# Altium schematic symbol library 场效应管.SchLib: 1062 symbols (part 2 of 4)
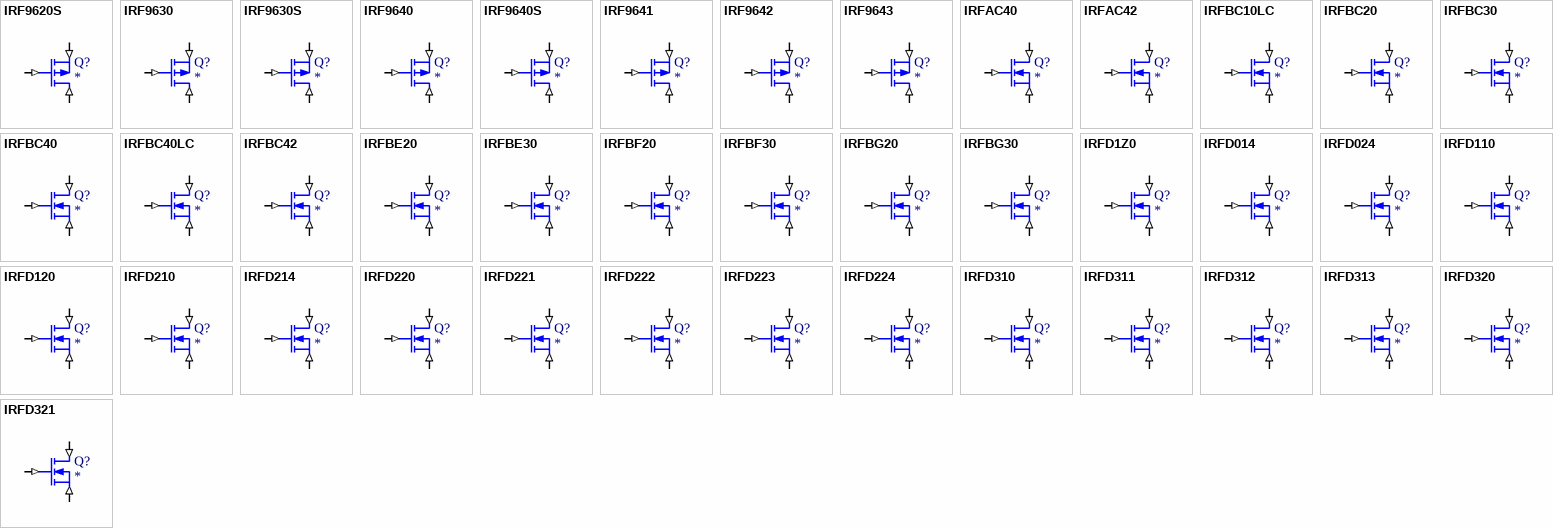
[diagram p27: symbols IRF9620S to IRFD321]

## IRFBC40
designator Q?
N-Channel MOSFET
simulation model IRFBC40 (SUBCKT)
pins: 1 D (in), 2 G (in), 3 S (in)
1 alternate drawing of the same symbol

## IRFBC40LC
designator Q?
N-Channel MOSFET
simulation model IRFBC40LC (SUBCKT)
pins: 1 D (in), 2 G (in), 3 S (in)
1 alternate drawing of the same symbol

## IRFBC42
designator Q?
N-Channel MOSFET
simulation model IRFBC42 (SUBCKT)
pins: 1 D (in), 2 G (in), 3 S (in)
1 alternate drawing of the same symbol

## IRFBE20
designator Q?
N-Channel MOSFET
simulation model IRFBE20 (SUBCKT)
pins: 1 D (in), 2 G (in), 3 S (in)
1 alternate drawing of the same symbol

## IRFBE30
designator Q?
N-Channel MOSFET
simulation model IRFBE30 (SUBCKT)
pins: 1 D (in), 2 G (in), 3 S (in)
1 alternate drawing of the same symbol

## IRFBF20
designator Q?
N-Channel MOSFET
simulation model IRFBF20 (SUBCKT)
pins: 1 D (in), 2 G (in), 3 S (in)
1 alternate drawing of the same symbol

## IRFBF30
designator Q?
N-Channel MOSFET
simulation model IRFBF30 (SUBCKT)
pins: 1 D (in), 2 G (in), 3 S (in)
1 alternate drawing of the same symbol

## IRFBG20
designator Q?
N-Channel MOSFET
simulation model IRFBG20 (SUBCKT)
pins: 1 D (in), 2 G (in), 3 S (in)
1 alternate drawing of the same symbol

## IRFBG30
designator Q?
N-Channel MOSFET
simulation model IRFBG30 (SUBCKT)
pins: 1 D (in), 2 G (in), 3 S (in)
1 alternate drawing of the same symbol

## IRFD1Z0
designator Q?
N-Channel MOSFET
simulation model IRFD1Z0 (SUBCKT)
pins: 1 D (in), 2 G (in), 3 S (in)
1 alternate drawing of the same symbol

## IRFD014
designator Q?
N-Channel MOSFET
simulation model IRFD014 (SUBCKT)
pins: 1 D (in), 2 G (in), 3 S (in)
1 alternate drawing of the same symbol

## IRFD024
designator Q?
N-Channel MOSFET
simulation model IRFD024 (SUBCKT)
pins: 1 D (in), 2 G (in), 3 S (in)
1 alternate drawing of the same symbol

## IRFD110
designator Q?
N-Channel MOSFET
simulation model IRFD110 (SUBCKT)
pins: 1 D (in), 2 G (in), 3 S (in)
1 alternate drawing of the same symbol

## IRFD120
designator Q?
N-Channel MOSFET
simulation model IRFD120 (SUBCKT)
pins: 1 D (in), 2 G (in), 3 S (in)
1 alternate drawing of the same symbol

## IRFD210
designator Q?
N-Channel MOSFET
simulation model IRFD210 (SUBCKT)
pins: 1 D (in), 2 G (in), 3 S (in)
1 alternate drawing of the same symbol

## IRFD214
designator Q?
N-Channel MOSFET
simulation model IRFD214 (SUBCKT)
pins: 1 D (in), 2 G (in), 3 S (in)
1 alternate drawing of the same symbol

## IRFD220
designator Q?
N-Channel MOSFET
simulation model IRFD220 (SUBCKT)
pins: 1 D (in), 2 G (in), 3 S (in)
1 alternate drawing of the same symbol

## IRFD221
designator Q?
N-Channel MOSFET
simulation model IRFD221 (SUBCKT)
pins: 1 D (in), 2 G (in), 3 S (in)
1 alternate drawing of the same symbol

## IRFD222
designator Q?
N-Channel MOSFET
simulation model IRFD222 (SUBCKT)
pins: 1 D (in), 2 G (in), 3 S (in)
1 alternate drawing of the same symbol

## IRFD223
designator Q?
N-Channel MOSFET
simulation model IRFD223 (SUBCKT)
pins: 1 D (in), 2 G (in), 3 S (in)
1 alternate drawing of the same symbol

## IRFD224
designator Q?
N-Channel MOSFET
simulation model IRFD224 (SUBCKT)
pins: 1 D (in), 2 G (in), 3 S (in)
1 alternate drawing of the same symbol

## IRFD310
designator Q?
N-Channel MOSFET
simulation model IRFD310 (SUBCKT)
pins: 1 D (in), 2 G (in), 3 S (in)
1 alternate drawing of the same symbol

## IRFD311
designator Q?
N-Channel MOSFET
simulation model IRFD311 (SUBCKT)
pins: 1 D (in), 2 G (in), 3 S (in)
1 alternate drawing of the same symbol

## IRFD312
designator Q?
N-Channel MOSFET
simulation model IRFD312 (SUBCKT)
pins: 1 D (in), 2 G (in), 3 S (in)
1 alternate drawing of the same symbol

## IRFD313
designator Q?
N-Channel MOSFET
simulation model IRFD313 (SUBCKT)
pins: 1 D (in), 2 G (in), 3 S (in)
1 alternate drawing of the same symbol

## IRFD320
designator Q?
N-Channel MOSFET
simulation model IRFD320 (SUBCKT)
pins: 1 D (in), 2 G (in), 3 S (in)
1 alternate drawing of the same symbol

## IRFD321
designator Q?
N-Channel MOSFET
simulation model IRFD321 (SUBCKT)
pins: 1 D (in), 2 G (in), 3 S (in)
1 alternate drawing of the same symbol

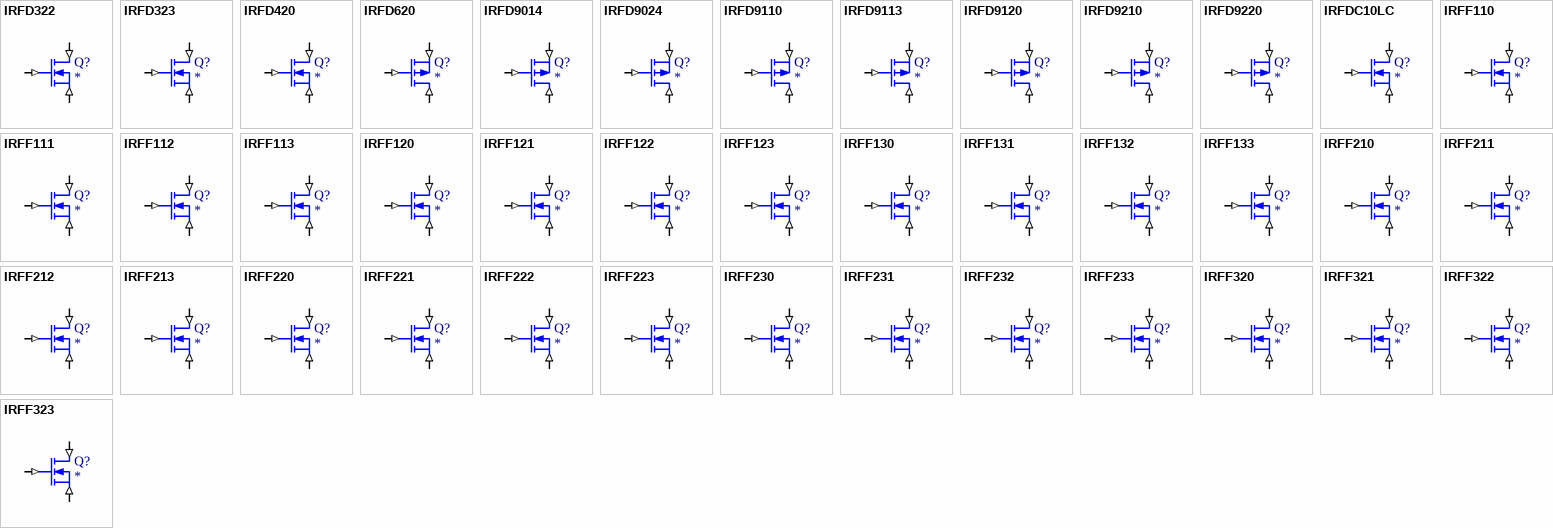
[diagram p9: symbols IRFD322 to IRFF323]

## IRFD322
designator Q?
N-Channel MOSFET
simulation model IRFD322 (SUBCKT)
pins: 1 D (in), 2 G (in), 3 S (in)
1 alternate drawing of the same symbol

## IRFD323
designator Q?
N-Channel MOSFET
simulation model IRFD323 (SUBCKT)
pins: 1 D (in), 2 G (in), 3 S (in)
1 alternate drawing of the same symbol

## IRFD420
designator Q?
N-Channel MOSFET
simulation model IRFD420 (SUBCKT)
pins: 1 D (in), 2 G (in), 3 S (in)
1 alternate drawing of the same symbol

## IRFD620
designator Q?
P-Channel MOSFET
simulation model IRFD620 (SUBCKT)
pins: 1 D (in), 2 G (in), 3 S (in)
1 alternate drawing of the same symbol

## IRFD9014
designator Q?
P-Channel MOSFET
simulation model IRFD9014 (SUBCKT)
pins: 1 D (in), 2 G (in), 3 S (in)
1 alternate drawing of the same symbol

## IRFD9024
designator Q?
P-Channel MOSFET
simulation model IRFD9024 (SUBCKT)
pins: 1 D (in), 2 G (in), 3 S (in)
1 alternate drawing of the same symbol

## IRFD9110
designator Q?
P-Channel MOSFET
simulation model IRFD9110 (SUBCKT)
pins: 1 D (in), 2 G (in), 3 S (in)
1 alternate drawing of the same symbol

## IRFD9113
designator Q?
P-Channel MOSFET
simulation model IRFD9113 (SUBCKT)
pins: 1 D (in), 2 G (in), 3 S (in)
1 alternate drawing of the same symbol

## IRFD9120
designator Q?
P-Channel MOSFET
simulation model IRFD9120 (SUBCKT)
pins: 1 D (in), 2 G (in), 3 S (in)
1 alternate drawing of the same symbol

## IRFD9210
designator Q?
P-Channel MOSFET
simulation model IRFD9210 (SUBCKT)
pins: 1 D (in), 2 G (in), 3 S (in)
1 alternate drawing of the same symbol

## IRFD9220
designator Q?
P-Channel MOSFET
simulation model IRFD9220 (SUBCKT)
pins: 1 D (in), 2 G (in), 3 S (in)
1 alternate drawing of the same symbol

## IRFDC10LC
designator Q?
N-Channel MOSFET
simulation model IRFDC10LC (SUBCKT)
pins: 1 D (in), 2 G (in), 3 S (in)
1 alternate drawing of the same symbol

## IRFF110
designator Q?
N-Channel MOSFET
simulation model IRFF110 (SUBCKT)
pins: 1 D (in), 2 G (in), 3 S (in)
1 alternate drawing of the same symbol

## IRFF111
designator Q?
N-Channel MOSFET
simulation model IRFF111 (SUBCKT)
pins: 1 D (in), 2 G (in), 3 S (in)
1 alternate drawing of the same symbol

## IRFF112
designator Q?
N-Channel MOSFET
simulation model IRFF112 (SUBCKT)
pins: 1 D (in), 2 G (in), 3 S (in)
1 alternate drawing of the same symbol

## IRFF113
designator Q?
N-Channel MOSFET
simulation model IRFF113 (SUBCKT)
pins: 1 D (in), 2 G (in), 3 S (in)
1 alternate drawing of the same symbol

## IRFF120
designator Q?
N-Channel MOSFET
simulation model IRFF120 (SUBCKT)
pins: 1 D (in), 2 G (in), 3 S (in)
1 alternate drawing of the same symbol

## IRFF121
designator Q?
N-Channel MOSFET
simulation model IRFF121 (SUBCKT)
pins: 1 D (in), 2 G (in), 3 S (in)
1 alternate drawing of the same symbol

## IRFF122
designator Q?
N-Channel MOSFET
simulation model IRFF122 (SUBCKT)
pins: 1 D (in), 2 G (in), 3 S (in)
1 alternate drawing of the same symbol

## IRFF123
designator Q?
N-Channel MOSFET
simulation model IRFF123 (SUBCKT)
pins: 1 D (in), 2 G (in), 3 S (in)
1 alternate drawing of the same symbol

## IRFF130
designator Q?
N-Channel MOSFET
simulation model IRFF130 (SUBCKT)
pins: 1 D (in), 2 G (in), 3 S (in)
1 alternate drawing of the same symbol

## IRFF131
designator Q?
N-Channel MOSFET
simulation model IRFF131 (SUBCKT)
pins: 1 D (in), 2 G (in), 3 S (in)
1 alternate drawing of the same symbol

## IRFF132
designator Q?
N-Channel MOSFET
simulation model IRFF132 (SUBCKT)
pins: 1 D (in), 2 G (in), 3 S (in)
1 alternate drawing of the same symbol

## IRFF133
designator Q?
N-Channel MOSFET
simulation model IRFF133 (SUBCKT)
pins: 1 D (in), 2 G (in), 3 S (in)
1 alternate drawing of the same symbol

## IRFF210
designator Q?
N-Channel MOSFET
simulation model IRFF210 (SUBCKT)
pins: 1 D (in), 2 G (in), 3 S (in)
1 alternate drawing of the same symbol

## IRFF211
designator Q?
N-Channel MOSFET
simulation model IRFF211 (SUBCKT)
pins: 1 D (in), 2 G (in), 3 S (in)
1 alternate drawing of the same symbol

## IRFF212
designator Q?
N-Channel MOSFET
simulation model IRFF212 (SUBCKT)
pins: 1 D (in), 2 G (in), 3 S (in)
1 alternate drawing of the same symbol

## IRFF213
designator Q?
N-Channel MOSFET
simulation model IRFF213 (SUBCKT)
pins: 1 D (in), 2 G (in), 3 S (in)
1 alternate drawing of the same symbol

## IRFF220
designator Q?
N-Channel MOSFET
simulation model IRFF220 (SUBCKT)
pins: 1 D (in), 2 G (in), 3 S (in)
1 alternate drawing of the same symbol

## IRFF221
designator Q?
N-Channel MOSFET
simulation model IRFF221 (SUBCKT)
pins: 1 D (in), 2 G (in), 3 S (in)
1 alternate drawing of the same symbol

## IRFF222
designator Q?
N-Channel MOSFET
simulation model IRFF222 (SUBCKT)
pins: 1 D (in), 2 G (in), 3 S (in)
1 alternate drawing of the same symbol

## IRFF223
designator Q?
N-Channel MOSFET
simulation model IRFF223 (SUBCKT)
pins: 1 D (in), 2 G (in), 3 S (in)
1 alternate drawing of the same symbol

## IRFF230
designator Q?
N-Channel MOSFET
simulation model IRFF230 (SUBCKT)
pins: 1 D (in), 2 G (in), 3 S (in)
1 alternate drawing of the same symbol

## IRFF231
designator Q?
N-Channel MOSFET
simulation model IRFF231 (SUBCKT)
pins: 1 D (in), 2 G (in), 3 S (in)
1 alternate drawing of the same symbol

## IRFF232
designator Q?
N-Channel MOSFET
simulation model IRFF232 (SUBCKT)
pins: 1 D (in), 2 G (in), 3 S (in)
1 alternate drawing of the same symbol

## IRFF233
designator Q?
N-Channel MOSFET
simulation model IRFF233 (SUBCKT)
pins: 1 D (in), 2 G (in), 3 S (in)
1 alternate drawing of the same symbol

## IRFF320
designator Q?
N-Channel MOSFET
simulation model IRFF320 (SUBCKT)
pins: 1 D (in), 2 G (in), 3 S (in)
1 alternate drawing of the same symbol

## IRFF321
designator Q?
N-Channel MOSFET
simulation model IRFF321 (SUBCKT)
pins: 1 D (in), 2 G (in), 3 S (in)
1 alternate drawing of the same symbol

## IRFF322
designator Q?
N-Channel MOSFET
simulation model IRFF322 (SUBCKT)
pins: 1 D (in), 2 G (in), 3 S (in)
1 alternate drawing of the same symbol

## IRFF323
designator Q?
N-Channel MOSFET
simulation model IRFF323 (SUBCKT)
pins: 1 D (in), 2 G (in), 3 S (in)
1 alternate drawing of the same symbol

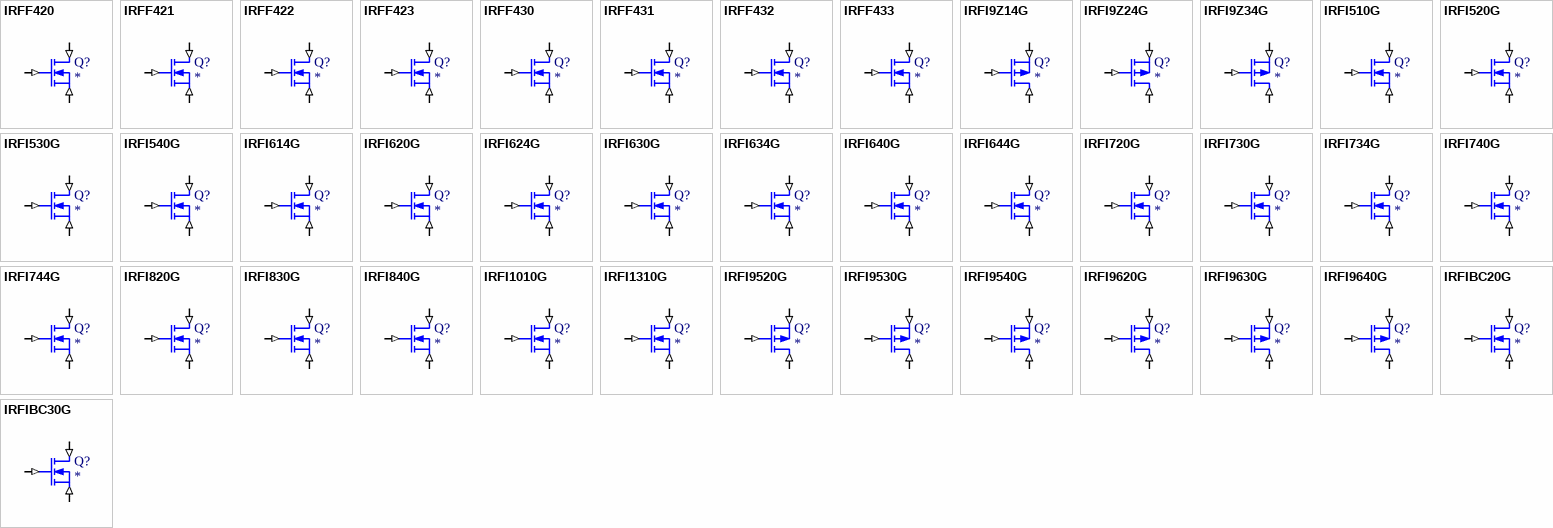
[diagram p10: symbols IRFF420 to IRFIBC30G]

## IRFF420
designator Q?
N-Channel MOSFET
simulation model IRFF420 (SUBCKT)
pins: 1 D (in), 2 G (in), 3 S (in)
1 alternate drawing of the same symbol

## IRFF421
designator Q?
N-Channel MOSFET
simulation model IRFF421 (SUBCKT)
pins: 1 D (in), 2 G (in), 3 S (in)
1 alternate drawing of the same symbol

## IRFF422
designator Q?
N-Channel MOSFET
simulation model IRFF422 (SUBCKT)
pins: 1 D (in), 2 G (in), 3 S (in)
1 alternate drawing of the same symbol

## IRFF423
designator Q?
N-Channel MOSFET
simulation model IRFF423 (SUBCKT)
pins: 1 D (in), 2 G (in), 3 S (in)
1 alternate drawing of the same symbol

## IRFF430
designator Q?
N-Channel MOSFET
simulation model IRFF430 (SUBCKT)
pins: 1 D (in), 2 G (in), 3 S (in)
1 alternate drawing of the same symbol

## IRFF431
designator Q?
N-Channel MOSFET
simulation model IRFF431 (SUBCKT)
pins: 1 D (in), 2 G (in), 3 S (in)
1 alternate drawing of the same symbol

## IRFF432
designator Q?
N-Channel MOSFET
simulation model IRFF432 (SUBCKT)
pins: 1 D (in), 2 G (in), 3 S (in)
1 alternate drawing of the same symbol

## IRFF433
designator Q?
N-Channel MOSFET
simulation model IRFF433 (SUBCKT)
pins: 1 D (in), 2 G (in), 3 S (in)
1 alternate drawing of the same symbol

## IRFI9Z14G
designator Q?
P-Channel MOSFET
simulation model IRFI9Z14G (SUBCKT)
pins: 1 D (in), 2 G (in), 3 S (in)
1 alternate drawing of the same symbol

## IRFI9Z24G
designator Q?
P-Channel MOSFET
simulation model IRFI9Z24G (SUBCKT)
pins: 1 D (in), 2 G (in), 3 S (in)
1 alternate drawing of the same symbol

## IRFI9Z34G
designator Q?
P-Channel MOSFET
simulation model IRFI9Z34G (SUBCKT)
pins: 1 D (in), 2 G (in), 3 S (in)
1 alternate drawing of the same symbol

## IRFI510G
designator Q?
N-Channel MOSFET
simulation model IRFI510G (SUBCKT)
pins: 1 D (in), 2 G (in), 3 S (in)
1 alternate drawing of the same symbol

## IRFI520G
designator Q?
N-Channel MOSFET
simulation model IRFI520G (SUBCKT)
pins: 1 D (in), 2 G (in), 3 S (in)
1 alternate drawing of the same symbol

## IRFI530G
designator Q?
N-Channel MOSFET
simulation model IRFI530G (SUBCKT)
pins: 1 D (in), 2 G (in), 3 S (in)
1 alternate drawing of the same symbol

## IRFI540G
designator Q?
N-Channel MOSFET
simulation model IRFI540G (SUBCKT)
pins: 1 D (in), 2 G (in), 3 S (in)
1 alternate drawing of the same symbol

## IRFI614G
designator Q?
N-Channel MOSFET
simulation model IRFI614G (SUBCKT)
pins: 1 D (in), 2 G (in), 3 S (in)
1 alternate drawing of the same symbol

## IRFI620G
designator Q?
N-Channel MOSFET
simulation model IRFI620G (SUBCKT)
pins: 1 D (in), 2 G (in), 3 S (in)
1 alternate drawing of the same symbol

## IRFI624G
designator Q?
N-Channel MOSFET
simulation model IRFI624G (SUBCKT)
pins: 1 D (in), 2 G (in), 3 S (in)
1 alternate drawing of the same symbol

## IRFI630G
designator Q?
N-Channel MOSFET
simulation model IRFI630G (SUBCKT)
pins: 1 D (in), 2 G (in), 3 S (in)
1 alternate drawing of the same symbol

## IRFI634G
designator Q?
N-Channel MOSFET
simulation model IRFI634G (SUBCKT)
pins: 1 D (in), 2 G (in), 3 S (in)
1 alternate drawing of the same symbol

## IRFI640G
designator Q?
N-Channel MOSFET
simulation model IRFI640G (SUBCKT)
pins: 1 D (in), 2 G (in), 3 S (in)
1 alternate drawing of the same symbol

## IRFI644G
designator Q?
N-Channel MOSFET
simulation model IRFI644G (SUBCKT)
pins: 1 D (in), 2 G (in), 3 S (in)
1 alternate drawing of the same symbol

## IRFI720G
designator Q?
N-Channel MOSFET
simulation model IRFI720G (SUBCKT)
pins: 1 D (in), 2 G (in), 3 S (in)
1 alternate drawing of the same symbol

## IRFI730G
designator Q?
N-Channel MOSFET
simulation model IRFI730G (SUBCKT)
pins: 1 D (in), 2 G (in), 3 S (in)
1 alternate drawing of the same symbol

## IRFI734G
designator Q?
N-Channel MOSFET
simulation model IRFI734G (SUBCKT)
pins: 1 D (in), 2 G (in), 3 S (in)
1 alternate drawing of the same symbol

## IRFI740G
designator Q?
N-Channel MOSFET
simulation model IRFI740G (SUBCKT)
pins: 1 D (in), 2 G (in), 3 S (in)
1 alternate drawing of the same symbol

## IRFI744G
designator Q?
N-Channel MOSFET
simulation model IRFI744G (SUBCKT)
pins: 1 D (in), 2 G (in), 3 S (in)
1 alternate drawing of the same symbol

## IRFI820G
designator Q?
N-Channel MOSFET
simulation model IRFI820G (SUBCKT)
pins: 1 D (in), 2 G (in), 3 S (in)
1 alternate drawing of the same symbol

## IRFI830G
designator Q?
N-Channel MOSFET
simulation model IRFI830G (SUBCKT)
pins: 1 D (in), 2 G (in), 3 S (in)
1 alternate drawing of the same symbol

## IRFI840G
designator Q?
N-Channel MOSFET
simulation model IRFI840G (SUBCKT)
pins: 1 D (in), 2 G (in), 3 S (in)
1 alternate drawing of the same symbol

## IRFI1010G
designator Q?
N-Channel MOSFET
simulation model IRFI1010G (SUBCKT)
pins: 1 D (in), 2 G (in), 3 S (in)
1 alternate drawing of the same symbol

## IRFI1310G
designator Q?
N-Channel MOSFET
simulation model IRFI1310G (SUBCKT)
pins: 1 D (in), 2 G (in), 3 S (in)
1 alternate drawing of the same symbol

## IRFI9520G
designator Q?
P-Channel MOSFET
simulation model IRFI9520G (SUBCKT)
pins: 1 D (in), 2 G (in), 3 S (in)
1 alternate drawing of the same symbol

## IRFI9530G
designator Q?
P-Channel MOSFET
simulation model IRFI9530G (SUBCKT)
pins: 1 D (in), 2 G (in), 3 S (in)
1 alternate drawing of the same symbol

## IRFI9540G
designator Q?
P-Channel MOSFET
simulation model IRFI9540G (SUBCKT)
pins: 1 D (in), 2 G (in), 3 S (in)
1 alternate drawing of the same symbol

## IRFI9620G
designator Q?
P-Channel MOSFET
simulation model IRFI9620G (SUBCKT)
pins: 1 D (in), 2 G (in), 3 S (in)
1 alternate drawing of the same symbol

## IRFI9630G
designator Q?
P-Channel MOSFET
simulation model IRFI9630G (SUBCKT)
pins: 1 D (in), 2 G (in), 3 S (in)
1 alternate drawing of the same symbol

## IRFI9640G
designator Q?
P-Channel MOSFET
simulation model IRFI9640G (SUBCKT)
pins: 1 D (in), 2 G (in), 3 S (in)
1 alternate drawing of the same symbol

## IRFIBC20G
designator Q?
N-Channel MOSFET
simulation model IRFIBC20G (SUBCKT)
pins: 1 D (in), 2 G (in), 3 S (in)
1 alternate drawing of the same symbol

## IRFIBC30G
designator Q?
N-Channel MOSFET
simulation model IRFIBC30G (SUBCKT)
pins: 1 D (in), 2 G (in), 3 S (in)
1 alternate drawing of the same symbol

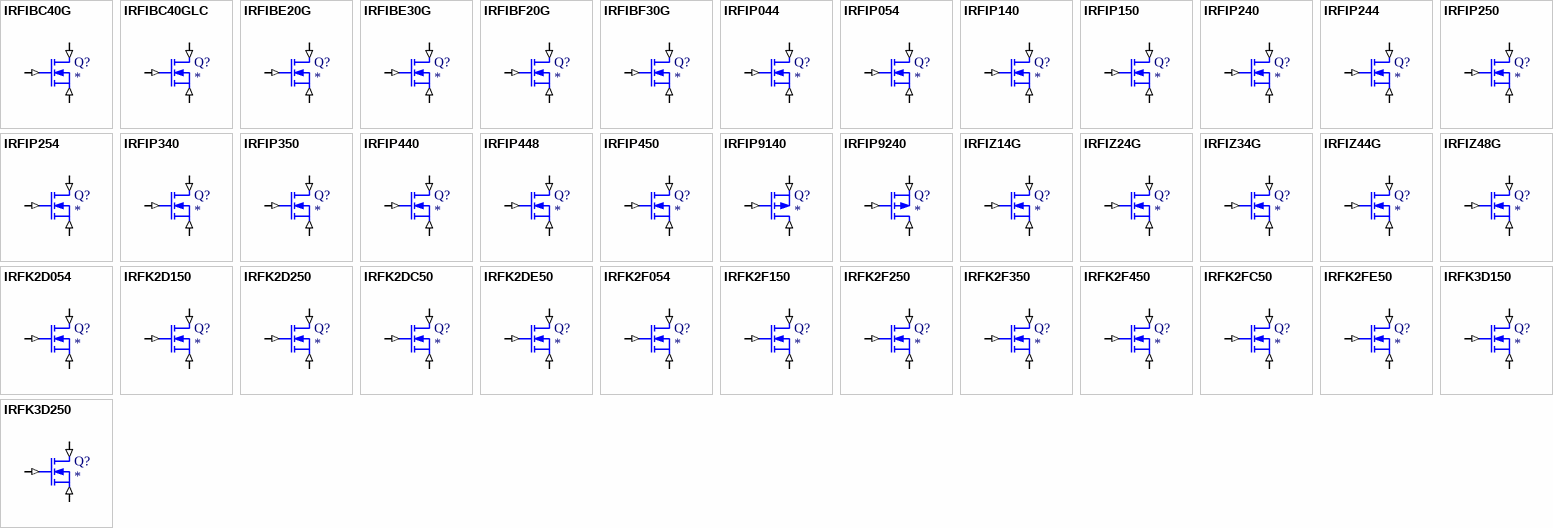
[diagram p11: symbols IRFIBC40G to IRFK3D250]

## IRFIBC40G
designator Q?
N-Channel MOSFET
simulation model IRFIBC40G (SUBCKT)
pins: 1 D (in), 2 G (in), 3 S (in)
1 alternate drawing of the same symbol

## IRFIBC40GLC
designator Q?
N-Channel MOSFET
simulation model IRFIBC40GLC (SUBCKT)
pins: 1 D (in), 2 G (in), 3 S (in)
1 alternate drawing of the same symbol

## IRFIBE20G
designator Q?
N-Channel MOSFET
simulation model IRFIBE20G (SUBCKT)
pins: 1 D (in), 2 G (in), 3 S (in)
1 alternate drawing of the same symbol

## IRFIBE30G
designator Q?
N-Channel MOSFET
simulation model IRFIBE30G (SUBCKT)
pins: 1 D (in), 2 G (in), 3 S (in)
1 alternate drawing of the same symbol

## IRFIBF20G
designator Q?
N-Channel MOSFET
simulation model IRFIBF20G (SUBCKT)
pins: 1 D (in), 2 G (in), 3 S (in)
1 alternate drawing of the same symbol

## IRFIBF30G
designator Q?
N-Channel MOSFET
simulation model IRFIBF30G (SUBCKT)
pins: 1 D (in), 2 G (in), 3 S (in)
1 alternate drawing of the same symbol

## IRFIP044
designator Q?
N-Channel MOSFET
simulation model IRFIP044 (SUBCKT)
pins: 1 D (in), 2 G (in), 3 S (in)
1 alternate drawing of the same symbol

## IRFIP054
designator Q?
N-Channel MOSFET
simulation model IRFIP054 (SUBCKT)
pins: 1 D (in), 2 G (in), 3 S (in)
1 alternate drawing of the same symbol

## IRFIP140
designator Q?
N-Channel MOSFET
simulation model IRFIP140 (SUBCKT)
pins: 1 D (in), 2 G (in), 3 S (in)
1 alternate drawing of the same symbol

## IRFIP150
designator Q?
N-Channel MOSFET
simulation model IRFIP150 (SUBCKT)
pins: 1 D (in), 2 G (in), 3 S (in)
1 alternate drawing of the same symbol

## IRFIP240
designator Q?
N-Channel MOSFET
simulation model IRFIP240 (SUBCKT)
pins: 1 D (in), 2 G (in), 3 S (in)
1 alternate drawing of the same symbol

## IRFIP244
designator Q?
N-Channel MOSFET
simulation model IRFIP244 (SUBCKT)
pins: 1 D (in), 2 G (in), 3 S (in)
1 alternate drawing of the same symbol

## IRFIP250
designator Q?
N-Channel MOSFET
simulation model IRFIP250 (SUBCKT)
pins: 1 D (in), 2 G (in), 3 S (in)
1 alternate drawing of the same symbol

## IRFIP254
designator Q?
N-Channel MOSFET
simulation model IRFIP254 (SUBCKT)
pins: 1 D (in), 2 G (in), 3 S (in)
1 alternate drawing of the same symbol

## IRFIP340
designator Q?
N-Channel MOSFET
simulation model IRFIP340 (SUBCKT)
pins: 1 D (in), 2 G (in), 3 S (in)
1 alternate drawing of the same symbol

## IRFIP350
designator Q?
N-Channel MOSFET
simulation model IRFIP350 (SUBCKT)
pins: 1 D (in), 2 G (in), 3 S (in)
1 alternate drawing of the same symbol

## IRFIP440
designator Q?
N-Channel MOSFET
simulation model IRFIP440 (SUBCKT)
pins: 1 D (in), 2 G (in), 3 S (in)
1 alternate drawing of the same symbol

## IRFIP448
designator Q?
N-Channel MOSFET
simulation model IRFIP448 (SUBCKT)
pins: 1 D (in), 2 G (in), 3 S (in)
1 alternate drawing of the same symbol

## IRFIP450
designator Q?
N-Channel MOSFET
simulation model IRFIP450 (SUBCKT)
pins: 1 D (in), 2 G (in), 3 S (in)
1 alternate drawing of the same symbol

## IRFIP9140
designator Q?
P-Channel MOSFET
simulation model IRFIP9140 (SUBCKT)
pins: 1 D (in), 2 G (in), 3 S (in)
1 alternate drawing of the same symbol

## IRFIP9240
designator Q?
P-Channel MOSFET
simulation model IRFIP9240 (SUBCKT)
pins: 1 D (in), 2 G (in), 3 S (in)
1 alternate drawing of the same symbol

## IRFIZ14G
designator Q?
N-Channel MOSFET
simulation model IRFIZ14G (SUBCKT)
pins: 1 D (in), 2 G (in), 3 S (in)
1 alternate drawing of the same symbol

## IRFIZ24G
designator Q?
N-Channel MOSFET
simulation model IRFIZ24G (SUBCKT)
pins: 1 D (in), 2 G (in), 3 S (in)
1 alternate drawing of the same symbol

## IRFIZ34G
designator Q?
N-Channel MOSFET
simulation model IRFIZ34G (SUBCKT)
pins: 1 D (in), 2 G (in), 3 S (in)
1 alternate drawing of the same symbol

## IRFIZ44G
designator Q?
N-Channel MOSFET
simulation model IRFIZ44G (SUBCKT)
pins: 1 D (in), 2 G (in), 3 S (in)
1 alternate drawing of the same symbol

## IRFIZ48G
designator Q?
N-Channel MOSFET
simulation model IRFIZ48G (SUBCKT)
pins: 1 D (in), 2 G (in), 3 S (in)
1 alternate drawing of the same symbol

## IRFK2D054
designator Q?
N-Channel MOSFET
simulation model IRFK2D054 (SUBCKT)
pins: 1 D (in), 2 G (in), 3 S (in)
1 alternate drawing of the same symbol

## IRFK2D150
designator Q?
N-Channel MOSFET
simulation model IRFK2D150 (SUBCKT)
pins: 1 D (in), 2 G (in), 3 S (in)
1 alternate drawing of the same symbol

## IRFK2D250
designator Q?
N-Channel MOSFET
simulation model IRFK2D250 (SUBCKT)
pins: 1 D (in), 2 G (in), 3 S (in)
1 alternate drawing of the same symbol

## IRFK2DC50
designator Q?
N-Channel MOSFET
simulation model IRFK2DC50 (SUBCKT)
pins: 1 D (in), 2 G (in), 3 S (in)
1 alternate drawing of the same symbol

## IRFK2DE50
designator Q?
N-Channel MOSFET
simulation model IRFK2DE50 (SUBCKT)
pins: 1 D (in), 2 G (in), 3 S (in)
1 alternate drawing of the same symbol

## IRFK2F054
designator Q?
N-Channel MOSFET
simulation model IRFK2F054 (SUBCKT)
pins: 1 D (in), 2 G (in), 3 S (in)
1 alternate drawing of the same symbol

## IRFK2F150
designator Q?
N-Channel MOSFET
simulation model IRFK2F150 (SUBCKT)
pins: 1 D (in), 2 G (in), 3 S (in)
1 alternate drawing of the same symbol

## IRFK2F250
designator Q?
N-Channel MOSFET
simulation model IRFK2F250 (SUBCKT)
pins: 1 D (in), 2 G (in), 3 S (in)
1 alternate drawing of the same symbol

## IRFK2F350
designator Q?
N-Channel MOSFET
simulation model IRFK2F350 (SUBCKT)
pins: 1 D (in), 2 G (in), 3 S (in)
1 alternate drawing of the same symbol

## IRFK2F450
designator Q?
N-Channel MOSFET
simulation model IRFK2F450 (SUBCKT)
pins: 1 D (in), 2 G (in), 3 S (in)
1 alternate drawing of the same symbol

## IRFK2FC50
designator Q?
N-Channel MOSFET
simulation model IRFK2FC50 (SUBCKT)
pins: 1 D (in), 2 G (in), 3 S (in)
1 alternate drawing of the same symbol

## IRFK2FE50
designator Q?
N-Channel MOSFET
simulation model IRFK2FE50 (SUBCKT)
pins: 1 D (in), 2 G (in), 3 S (in)
1 alternate drawing of the same symbol

## IRFK3D150
designator Q?
N-Channel MOSFET
simulation model IRFK3D150 (SUBCKT)
pins: 1 D (in), 2 G (in), 3 S (in)
1 alternate drawing of the same symbol

## IRFK3D250
designator Q?
N-Channel MOSFET
simulation model IRFK3D250 (SUBCKT)
pins: 1 D (in), 2 G (in), 3 S (in)
1 alternate drawing of the same symbol

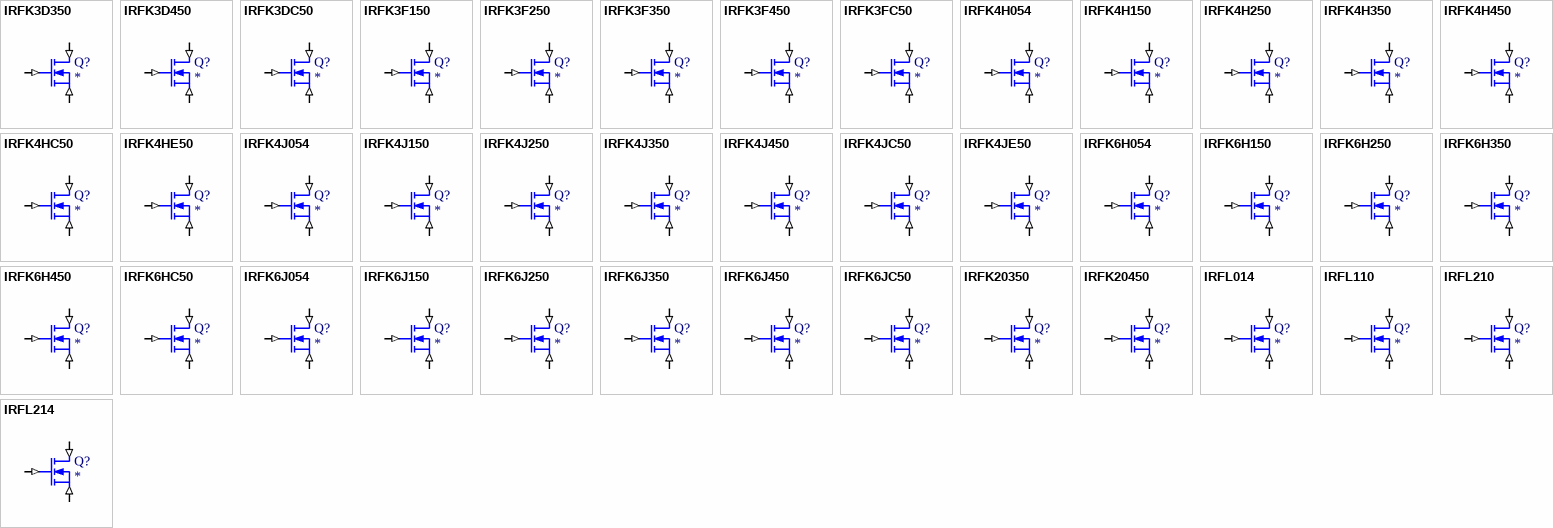
[diagram p12: symbols IRFK3D350 to IRFL214]

## IRFK3D350
designator Q?
N-Channel MOSFET
simulation model IRFK3D350 (SUBCKT)
pins: 1 D (in), 2 G (in), 3 S (in)
1 alternate drawing of the same symbol

## IRFK3D450
designator Q?
N-Channel MOSFET
simulation model IRFK3D450 (SUBCKT)
pins: 1 D (in), 2 G (in), 3 S (in)
1 alternate drawing of the same symbol

## IRFK3DC50
designator Q?
N-Channel MOSFET
simulation model IRFK3DC50 (SUBCKT)
pins: 1 D (in), 2 G (in), 3 S (in)
1 alternate drawing of the same symbol

## IRFK3F150
designator Q?
N-Channel MOSFET
simulation model IRFK3F150 (SUBCKT)
pins: 1 D (in), 2 G (in), 3 S (in)
1 alternate drawing of the same symbol

## IRFK3F250
designator Q?
N-Channel MOSFET
simulation model IRFK3F250 (SUBCKT)
pins: 1 D (in), 2 G (in), 3 S (in)
1 alternate drawing of the same symbol

## IRFK3F350
designator Q?
N-Channel MOSFET
simulation model IRFK3F350 (SUBCKT)
pins: 1 D (in), 2 G (in), 3 S (in)
1 alternate drawing of the same symbol

## IRFK3F450
designator Q?
N-Channel MOSFET
simulation model IRFK3F450 (SUBCKT)
pins: 1 D (in), 2 G (in), 3 S (in)
1 alternate drawing of the same symbol

## IRFK3FC50
designator Q?
N-Channel MOSFET
simulation model IRFK3FC50 (SUBCKT)
pins: 1 D (in), 2 G (in), 3 S (in)
1 alternate drawing of the same symbol
